# Altium footprint library Led.PcbLib: 53 footprints (part 2 of 4)
Each footprint in its own frame and in the unit in brackets; x right, y up, seen from the top. Pads: shape width x height; smd on the part's side, far side on the other; paste and mask are expansions set on the pad; w line width, h text height; cw(c..) or ccw(c..) is an arc to the next point about the centre after c.
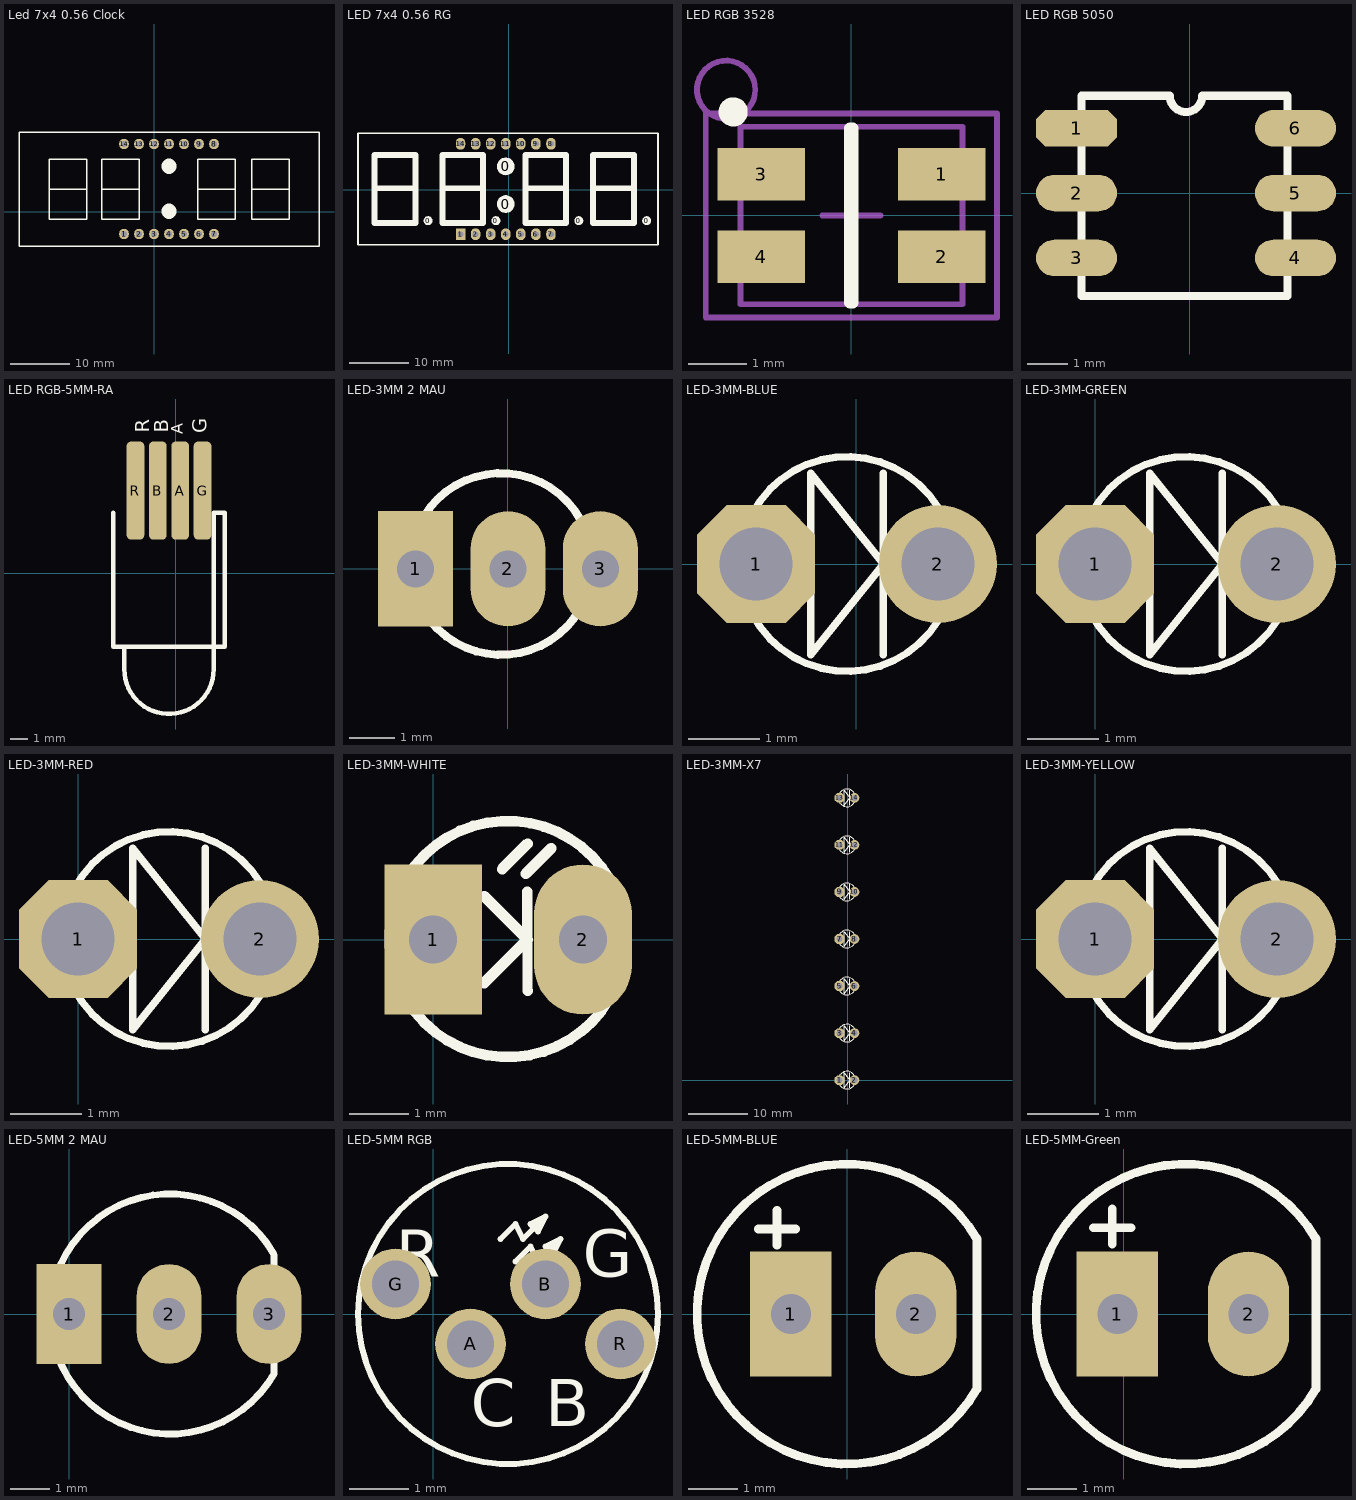
[diagram p1: the footprints below, top view; thin cyan lines are the x and y axes]

## Led 7x4 0.56 Clock [mil]
pads (14):
  oval 65x70 hole 40: 1(-200,-150) 2(-100,-150) 3(0,-150) 4(100,-150) 5(200,-150) 6(300,-150) 7(400,-150) 8(400,450) 9(300,450) 10(200,450) 11(100,450) 12(0,450) 13(-100,450) 14(-200,450)
Top Overlay:
  lines w10: -700,150 -450,150 ; -350,150 -100,150 ; 290,150 540,150 ; 650,150 900,150 ; -900,-230 -900,530 1100,530 1100,-230 -900,-230 ; -700,-50 -450,-50 -450,350 -700,350 -700,-50 ; -350,-50 -100,-50 -100,350 -350,350 -350,-50 ; 290,-50 540,-50 540,350 290,350 290,-50 ; 650,-50 900,-50 900,350 650,350 650,-50
  lines w100: 100,0 ccw(c72,4) 100.28,4 ; 100,300 ccw(c72,304) 100.28,304
3D body "7seg clock.step": height 280.13, standoff -196.25, extent -890.15,-224.01 1090.16,524.02

## LED 7x4 0.56 RG [mil]
pads (20):
  round 60 on Top Overlay: 0(-535,-205) 0(-85,-205) 0(465,-205) 0(915,-205)
  round 118.11 on Top Overlay: 0(-20,-95) 0(-20,155)
  rect 62.99x78.74 hole 39.37: 1(-320,-295)
  oval 62.99x78.74 hole 39.37: 2(-220,-295) 3(-120,-295) 4(-20,-295) 5(80,-295) 6(180,-295) 7(280,-295) 8(280,305) 9(180,305) 10(80,305) 11(-20,305) 12(-120,305) 13(-220,305) 14(-320,305)
Top Overlay:
  lines w10: -1000,-365 -1000,375 990,375 990,-365 -1000,-365
  lines w39.37: -885,10 -620,10 ; -435,10 -170,10 ; 115,10 380,10 ; 565,10 830,10 ; -890,-220 -890,230 -620,230 -620,-220 -890,-220 ; -440,-220 -440,230 -170,230 -170,-220 -440,-220 ; 110,-220 110,230 380,230 380,-220 110,-220 ; 560,-220 560,230 830,230 830,-220 560,-220
3D body "7seg2-4.STEP": height 564.96, standoff 112.2, extent -995.16,-370 985.16,378.03
3D body "SOCKET6.stp": height 276.19, standoff -117.51, extent -325,-334.99 275,-234.99
3D body "SOCKET6.stp": height 276.19, standoff -117.51, extent -325,260 275,360

## LED RGB 3528 [mm] "Chip LED, 4-Leads, Body 2.8x3.5mm (max), Pitch 1.42mm, IPC Medium Density"
height 1.9
pads (4):
  rect 1.5x0.9 smd: 1(1.55,0.707) 2(1.55,-0.71) 3(-1.55,0.707) 4(-1.55,-0.707)
Top Overlay:
  circle w0.25: c-2.03,1.778 r0.125
  lines w0.2: -0.025,-1.5 0.025,-1.5 0.025,1.5 -0.025,1.5 -0.025,-1.5
Mechanical 13:
  circle w0.1: c-2.151,2.159 r0.5
  lines w0.1: -1.905,-1.524 1.905,-1.524 1.905,1.524 -1.905,1.524 -1.905,-1.524
Mechanical 15:
  lines w0.1: -0.5,0 0.5,0 ; 0,-0.5 0,0.5 ; -2.5,-1.75 2.5,-1.75 2.5,1.75 -2.5,1.75 -2.5,-1.75
3D body "WL-SBTW_1411_RV.stp": height 1.87, standoff -0.03, extent -1.75,-1.4 1.75,1.4

## LED RGB 5050 [mm]
pads (6):
  oct 2x0.9 smd: 1(-2.794,1.6)
  oval 2x0.9 smd: 2(-2.794,0) 3(-2.794,-1.6) 4(2.606,-1.6) 5(2.606,0) 6(2.606,1.6)
Top Overlay:
  lines w0.2: -2.667,-2.54 -2.667,2.4 -0.494,2.4 ccw(c-0.094,2.4) 0.306,2.4 2.413,2.4 2.413,-2.54 -2.667,-2.54
3D body "User Library-smd_led_5050.step": height 1.6, standoff 0, extent -2.777,-2.54 2.523,2.46

## LED RGB-5MM-RA [mil] "LED RGB Right Angle 5mm"
height 5
pads (4):
  rrect50% 39.37x220 smd paste+1.5 mask+1.5: A(10,185) B(-40,185) G(60,185) R(-90,185)
Top Overlay:
  lines w10: -140,135 -140,-165 110,-165 110,135 85,135 85,-165 85,-215 cw(c-15,-215) -115,-215 -115,-165
  text "B" at -16.79,314.49 h31.5
  text "R" at -58.97,314.49 h31.5
  text "A" at 24.77,311.4 h45
  text "G" at 69.77,313.32 h31.5
3D body: height 5, standoff 0, extent -105.68,-298.7 74.45,281.58
3D body: height 99.8, standoff -99.8, extent -115.3,-198.8 83.91,1.2
3D body: height 100, standoff -100, extent -115.18,-301.8 83.78,-102.65

## LED-3MM 2 MAU [mil] "LED 3 PIN, 3ly Two colour"
height 300
pads (3):
  rect 65x100 hole 32: 1(-80,0)
  oval 65x100 hole 32: 2(0,0) 3(80,0)
Top Overlay:
  lines w7: 63,-34 63,42
  lines w7.01: 62.87,42.48 ccw(c-5.92,4.16) 62.97,-33.98
3D body "User Library-LED RG.step": height 293.12, standoff -235.62, extent -88.58,-80 88.58,77.48

## LED-3MM-BLUE [mil]
pads (2):
  oct 65x65 hole 40: 1(-55,0)
  round 65 hole 40: 2(45,0)
Top Overlay:
  circle w4: c-5,0 r59.06
  lines w4: 15,-50 15,0 ; 15,50 15,0 ; 15,0 -25,-50 -25,50 15,0
3D body "User Library-LED_d3-BLU.STEP": height 184.06, standoff -110.24, extent -72.46,-64.95 54.06,64.96

## LED-3MM-GREEN [mil]
pads (2):
  oct 65x65 hole 40: 1(0,0)
  round 65 hole 40: 2(100,0)
Top Overlay:
  circle w4: c50,0 r59.06
  lines w4: 70,-50 70,0 ; 70,50 70,0 ; 70,0 30,-50 30,50 70,0
3D body "User Library-LED_d3-GRN.STEP": height 182.09, standoff -112.2, extent -15,-69.91 111.51,60

## LED-3MM-RED [mil]
pads (2):
  oct 65x65 hole 40: 1(0,0)
  round 65 hole 40: 2(100,0)
Top Overlay:
  circle w4: c50,0 r59.06
  lines w4: 70,-50 70,0 ; 70,50 70,0 ; 70,0 30,-50 30,50 70,0
3D body "User Library-LED-D3R.step": height 181.1, standoff -255.91, extent -27.18,-77.48 117.18,80

## LED-3MM-WHITE [mil] "LED 2 PIN, 3ly Only colour"
height 300
pads (2):
  rect 65x100 hole 32: 1(0,0)
  oval 65x100 hole 32: 2(100,0)
Top Overlay:
  lines w7: 34,-29 63,0 34,29 ; 46,47 63,64 ; 62,44 79,61 ; 63,-34 63,32 ; 117.92,-39.35 117.92,39.84
  lines w7.01: 117.57,-39.74 cw(c49.8,0.35) 117.72,40.19
3D body "SW3DPS-LED DIP 3MM-DEFAULT.STEP": height 217.14, standoff -117.51, extent -24.8,-74.81 112.99,74.8

## LED-3MM-X7 [mil]
pads (14):
  oct 65x65 hole 40: 1(-55,0) 3(-55,314.96) 5(-55,629.92) 7(-55,944.88) 9(-55,1259.84) 11(-55,1574.8) 13(-55,1889.76)
  round 65 hole 40: 2(45,0) 4(45,314.96) 6(45,629.92) 8(45,944.88) 10(45,1259.84) 12(45,1574.8) 14(45,1889.76)
Top Overlay:
  circle w4: c-5,1889.8 r59.06
  circle w4: c-5,1574.84 r59.06
  circle w4: c-5,1259.88 r59.06
  circle w4: c-5,944.92 r59.06
  circle w4: c-5,629.96 r59.06
  circle w4: c-5,315 r59.06
  circle w4: c-5,0 r59.06
  lines w4: 15,-50 15,0 ; 15,50 15,0 ; 15,265 15,315 ; 15,365 15,315 ; 15,579.96 15,629.96 ; 15,679.96 15,629.96 ; 15,894.92 15,944.92 ; 15,994.92 15,944.92 ; 15,1209.88 15,1259.88 ; 15,1309.88 15,1259.88 ; 15,1524.84 15,1574.84 ; 15,1624.84 15,1574.84 ; 15,1839.8 15,1889.8 ; 15,1939.8 15,1889.8 ; 15,0 -25,50 -25,-50 15,0 ; 15,315 -25,365 -25,265 15,315 ; 15,629.96 -25,679.96 -25,579.96 15,629.96 ; 15,944.92 -25,994.92 -25,894.92 15,944.92 ; 15,1259.88 -25,1309.88 -25,1209.88 15,1259.88 ; 15,1574.84 -25,1624.84 -25,1524.84 15,1574.84 ; 15,1889.8 -25,1939.8 -25,1839.8 15,1889.8
3D body "Download_STP_151033RS03000_rev1.stp": height 996.06, standoff -251.97, extent -80.2,-80 70.2,72.75
3D body "Download_STP_151033RS03000_rev1.stp": height 996.06, standoff -251.97, extent -78.29,230.98 72.1,383.73
3D body "Download_STP_151033RS03000_rev1.stp": height 996.06, standoff -251.97, extent -78.29,550.98 72.1,703.73
3D body "Download_STP_151033RS03000_rev1.stp": height 996.06, standoff -251.97, extent -73.29,870.98 77.1,1023.73
3D body "Download_STP_151033RS03000_rev1.stp": height 996.06, standoff -251.97, extent -78.29,1180.98 72.1,1333.73
3D body "Download_STP_151033RS03000_rev1.stp": height 996.06, standoff -251.97, extent -78.29,1495.98 72.1,1648.73
3D body "Download_STP_151033RS03000_rev1.stp": height 996.06, standoff -251.97, extent -78.29,1810.98 72.1,1963.73

## LED-3MM-YELLOW [mil]
pads (2):
  oct 65x65 hole 40: 1(0,0)
  round 65 hole 40: 2(100,0)
Top Overlay:
  circle w4: c50,0 r59.06
  lines w4: 70,-50 70,0 ; 70,50 70,0 ; 70,0 30,-50 30,50 70,0
3D body "User Library-LED-D3Y.step": height 181.1, standoff -255.91, extent -27.18,-77.48 117.18,80

## LED-5MM 2 MAU [mil] "LED 3 PIN, 5 ly , Two colour"
height 300
pads (3):
  rect 65x100 hole 32: 1(0,0)
  oval 65x100 hole 32: 2(100,0) 3(200,0)
Top Overlay:
  lines w7: 204.51,60.71 ccw(c101,0) 204.94,-59.97 ; 205,-59 205,59
3D body "User Library-5mmBiColorLED.step": height 426.6, standoff -102.4, extent -16,-115.98 210,115.98

## LED-5MM RGB [mm]
pads (4):
  round 1.2 hole 0.8: A(0.635,-0.508) B(1.905,0.508) G(-0.635,0.508) R(3.175,-0.508)
Top Overlay:
  circle w0.102: c1.27,0 r2.54
  lines w0.102: 1.143,1.27 1.397,1.524 1.524,1.27 1.905,1.651 ; 1.397,0.889 1.651,1.143 1.778,0.889 2.159,1.27 ; 1.718,1.464 1.651,1.524 ; 1.972,1.083 1.905,1.143 ; 1.651,1.524 1.905,1.651 ; 1.651,1.524 1.778,1.397 1.905,1.651 ; 1.905,1.143 2.159,1.27 ; 1.905,1.143 2.032,1.016 2.159,1.27
  text "C" at 0.635,-1.905 h0.8
  text "G" at 2.54,0.635 h0.8
  text "B" at 1.905,-1.905 h0.8
  text "R" at -0.635,0.635 h0.8
3D body: height 4.06, standoff 3.81, extent 0.381,-0.813 2.21,-0.254
3D body: height 4.06, standoff 3.81, extent 2.464,-0.711 2.692,-0.356
3D body: height 1.52, standoff -3.05, extent 2.908,-0.838 3.543,-0.203
3D body: height 3.81, standoff 1.27, extent 2.464,-0.838 3.556,-0.203
3D body: height 4.06, standoff 3.81, extent 0.457,0 0.813,0.229
3D body: height 1.52, standoff -3.05, extent 0.33,-0.851 0.965,-0.216
3D body: height 3.81, standoff 1.27, extent 0.33,-0.864 0.965,0.229
3D body: height 1.27, standoff -3.05, extent 1.524,0.216 2.159,0.851
3D body: height 3.81, standoff 1.27, extent -0.889,0.203 0.203,0.838
3D body: height 3.81, standoff 1.27, extent 1.067,0.216 2.159,0.851
3D body: height 4.06, standoff 3.81, extent 0.356,-0.965 0.914,0.864
3D body: height 1.52, standoff -3.05, extent -0.876,0.203 -0.241,0.838
3D body: height 4.06, standoff 3.81, extent -0.025,0.356 0.203,0.711
3D body: height 4.06, standoff 3.81, extent 1.27,0.406 1.524,0.66
3D body: height 6.86, standoff 1.78, extent -1.27,-2.54 3.79,2.53
3D body: height 9.4, standoff 4.32, extent -1.27,-2.54 3.783,2.518
3D body: height 2.79, standoff 1.78, extent -1.401,-2.667 3.912,2.656

## LED-5MM-BLUE [mil] "LED 2 PIN, 5 ly , Only colour, pin to pin 110mil"
height 300
pads (2):
  rect 65x100 hole 32: 1(-45,0)
  oval 65x100 hole 32: 2(55,0)
Top Overlay:
  lines w7: -71,68 -41,68 ; -56,55 -56,83 ; 103.51,60.71 ccw(c0,0) 103.94,-59.97 ; 104,-59 104,60
3D body "User Library-LEDd5B.STEP": height 339.18, standoff -243.49, extent -113.31,-120.49 100.08,116.5

## LED-5MM-Green [mil] "LED 2 PIN, 5 ly , Only colour,pin to pin 100mil"
height 300
pads (2):
  rect 65x100 hole 32: 1(-5,0)
  oval 65x100 hole 32: 2(100,0)
Top Overlay:
  lines w7: -24,69 6,69 ; -9,56 -9,84 ; 153.51,60.71 ccw(c50,0) 153.94,-59.97 ; 154,-59 154,60
3D body "SW3dPS-LEDd5G.STEP": height 339.18, standoff -243.49, extent -68.69,-119.99 144.69,117